# Altium footprint library WR-TBL_Pluggable PCB Header.PcbLib: 719 footprints (part 27 of 45)
Each footprint in its own frame and in the unit in brackets; x right, y up, seen from the top. Pads: shape width x height; smd on the part's side, far side on the other; paste and mask are expansions set on the pad; w line width, h text height; cw(c..) or ccw(c..) is an arc to the next point about the centre after c.
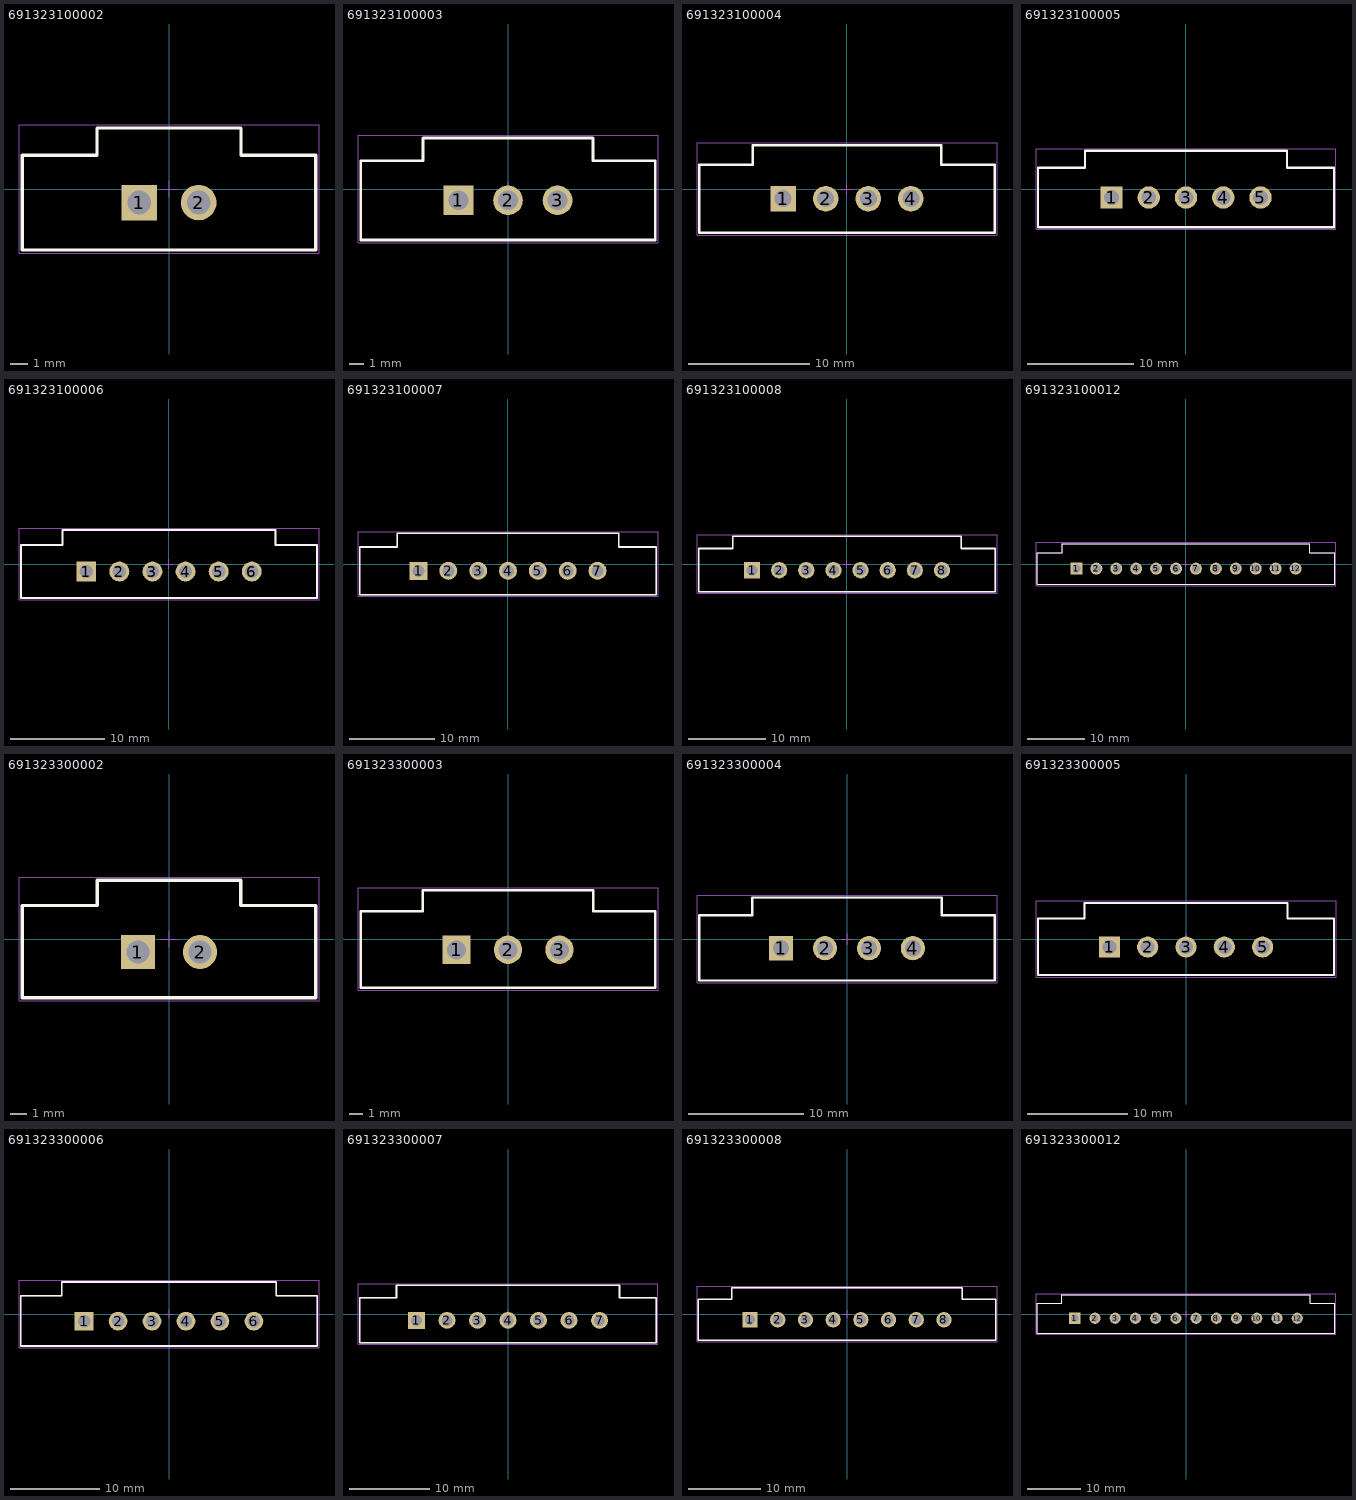
[diagram p26: the footprints below, top view; thin cyan lines are the x and y axes]

## 691323100002 [mm] "Vertical PCB Header with Flanges, pitch 3.5mm, 02p"
height 9.2
pads (2):
  rect 2.1x2.1 hole 1.4: 1(-1.75,-0.8)
  round 2.1 hole 1.4: 2(1.75,-0.8)
Top Overlay:
  lines w0.2: -8.65,-3.6 8.65,-3.6 8.65,2 4.25,2 4.25,3.6 -4.25,3.6 -4.25,2 -8.65,2 -8.65,-3.6
Mechanical 13:
  lines w0.1: -8.65,-3.6 -8.65,2 -4.25,2 -4.25,3.6 4.25,3.6 4.25,2 8.65,2 8.65,-3.6 -8.65,-3.6
Mechanical 15:
  lines w0.05: -0.5,0 0.5,0 ; 0,-0.5 0,0.5 ; -8.85,-3.8 8.85,-3.8 8.85,3.8 -8.85,3.8 -8.85,-3.8
3D body "691323100002.stp": height 9.3, standoff -3.4, extent -8.65,-3.6 8.65,3.6

## 691323100003 [mm] "Vertical PCB Header with Flanges, pitch 3.5mm, 03p"
height 9.2
pads (3):
  rect 2.1x2.1 hole 1.4: 1(-3.5,-0.8)
  round 2.1 hole 1.4: 2(0,-0.8) 3(3.5,-0.8)
Top Overlay:
  lines w0.2: -10.4,-3.6 -10.4,2 -6,2 -6,3.6 6,3.6 6,2 10.4,2 10.4,-3.6 -10.4,-3.6
Mechanical 13:
  lines w0.1: -10.4,-3.6 10.4,-3.6 10.4,2 6,2 6,3.6 -6,3.6 -6,2 -10.4,2 -10.4,-3.6
Mechanical 15:
  lines w0.05: -0.5,0 0.5,0 ; 0,-0.5 0,0.5 ; -10.6,-3.8 -10.6,3.8 10.6,3.8 10.6,-3.8 -10.6,-3.8
3D body "691323100003.stp": height 9.3, standoff -3.4, extent -10.4,-3.6 10.4,3.6

## 691323100004 [mm] "Vertical PCB Header with Flanges, pitch 3.5mm, 04p"
height 9.2
pads (4):
  rect 2.1x2.1 hole 1.4: 1(-5.25,-0.8)
  round 2.1 hole 1.4: 2(-1.75,-0.8) 3(1.75,-0.8) 4(5.25,-0.8)
Top Overlay:
  lines w0.2: -12.15,-3.6 -12.15,2 -7.75,2 -7.75,3.6 7.75,3.6 7.75,2 12.15,2 12.15,-3.6 -12.15,-3.6
Mechanical 13:
  lines w0.1: -12.15,-3.6 12.15,-3.6 12.15,2 7.75,2 7.75,3.6 -7.75,3.6 -7.75,2 -12.15,2 -12.15,-3.6
Mechanical 15:
  lines w0.05: -0.5,0 0.5,0 ; 0,-0.5 0,0.5 ; -12.35,-3.8 -12.35,3.8 12.35,3.8 12.35,-3.8 -12.35,-3.8
3D body "691323100004.stp": height 9.3, standoff -3.4, extent -12.15,-3.6 12.15,3.6

## 691323100005 [mm] "Vertical PCB Header with Flanges, pitch 3.5mm, 05p"
height 9.2
pads (5):
  rect 2.1x2.1 hole 1.4: 1(-7,-0.8)
  round 2.1 hole 1.4: 2(-3.5,-0.8) 3(0,-0.8) 4(3.5,-0.8) 5(7,-0.8)
Top Overlay:
  lines w0.2: -13.9,-3.6 -13.9,2 -9.5,2 -9.5,3.6 9.5,3.6 9.5,2 13.9,2 13.9,-3.6 -13.9,-3.6
Mechanical 13:
  lines w0.1: -13.9,-3.6 13.9,-3.6 13.9,2 9.5,2 9.5,3.6 -9.5,3.6 -9.5,2 -13.9,2 -13.9,-3.6
Mechanical 15:
  lines w0.05: -0.5,0 0.5,0 ; 0,-0.5 0,0.5 ; -14.1,-3.8 -14.1,3.8 14.1,3.8 14.1,-3.8 -14.1,-3.8
3D body "691323100005.stp": height 9.3, standoff -3.4, extent -13.9,-3.6 13.9,3.6

## 691323100006 [mm] "Vertical PCB Header with Flanges, pitch 3.5mm, 06p"
height 9.2
pads (6):
  rect 2.1x2.1 hole 1.4: 1(-8.75,-0.8)
  round 2.1 hole 1.4: 2(-5.25,-0.8) 3(-1.75,-0.8) 4(1.75,-0.8) 5(5.25,-0.8) 6(8.75,-0.8)
Top Overlay:
  lines w0.2: -15.65,-3.6 -15.65,2 -11.25,2 -11.25,3.6 11.25,3.6 11.25,2 15.65,2 15.65,-3.6 -15.65,-3.6
Mechanical 13:
  lines w0.1: -15.65,-3.6 15.65,-3.6 15.65,2 11.25,2 11.25,3.6 -11.25,3.6 -11.25,2 -15.65,2 -15.65,-3.6
Mechanical 15:
  lines w0.05: -0.5,0 0.5,0 ; 0,-0.5 0,0.5 ; -15.85,-3.8 -15.85,3.8 15.85,3.8 15.85,-3.8 -15.85,-3.8
3D body "691323100006.stp": height 9.3, standoff -3.4, extent -15.65,-3.6 15.65,3.6

## 691323100007 [mm] "Vertical PCB Header with Flanges, pitch 3.5mm, 07p"
height 9.2
pads (7):
  rect 2.1x2.1 hole 1.4: 1(-10.5,-0.8)
  round 2.1 hole 1.4: 2(-7,-0.8) 3(-3.5,-0.8) 4(0,-0.8) 5(3.5,-0.8) 6(7,-0.8) 7(10.5,-0.8)
Top Overlay:
  lines w0.2: -17.4,-3.6 17.4,-3.6 17.4,2 13,2 13,3.6 -13,3.6 -13,2 -17.4,2 -17.4,-3.6
Mechanical 13:
  lines w0.1: -17.4,-3.6 -17.4,2 -13,2 -13,3.6 13,3.6 13,2 17.4,2 17.4,-3.6 -17.4,-3.6
Mechanical 15:
  lines w0.05: -0.5,0 0.5,0 ; 0,-0.5 0,0.5 ; -17.6,-3.8 17.6,-3.8 17.6,3.8 -17.6,3.8 -17.6,-3.8
3D body "691323100007.stp": height 9.3, standoff -3.4, extent -17.4,-3.6 17.4,3.6

## 691323100008 [mm] "Vertical PCB Header with Flanges, pitch 3.5mm, 08p"
height 9.2
pads (8):
  rect 2.1x2.1 hole 1.4: 1(-12.25,-0.8)
  round 2.1 hole 1.4: 2(-8.75,-0.8) 3(-5.25,-0.8) 4(-1.75,-0.8) 5(1.75,-0.8) 6(5.25,-0.8) 7(8.75,-0.8) 8(12.25,-0.8)
Top Overlay:
  lines w0.2: -19.15,-3.6 19.15,-3.6 19.15,2 14.75,2 14.75,3.6 -14.75,3.6 -14.75,2 -19.15,2 -19.15,-3.6
Mechanical 13:
  lines w0.1: -19.15,-3.6 -19.15,2 -14.75,2 -14.75,3.6 14.75,3.6 14.75,2 19.15,2 19.15,-3.6 -19.15,-3.6
Mechanical 15:
  lines w0.05: -0.5,0 0.5,0 ; 0,-0.5 0,0.5 ; -19.35,-3.8 19.35,-3.8 19.35,3.8 -19.35,3.8 -19.35,-3.8
3D body "691323100008.stp": height 9.3, standoff -3.4, extent -19.15,-3.6 19.15,3.6

## 691323100012 [mm] "Vertical PCB Header with Flanges, pitch 3.5mm, 12p"
height 9.2
pads (12):
  rect 2.1x2.1 hole 1.4: 1(-19.25,-0.8)
  round 2.1 hole 1.4: 2(-15.75,-0.8) 3(-12.25,-0.8) 4(-8.75,-0.8) 5(-5.25,-0.8) 6(-1.75,-0.8) 7(1.75,-0.8) 8(5.25,-0.8) 9(8.75,-0.8) 10(12.25,-0.8) 11(15.75,-0.8) 12(19.25,-0.8)
Top Overlay:
  lines w0.2: -26.15,-3.6 26.15,-3.6 26.15,2 21.75,2 21.75,3.6 -21.75,3.6 -21.75,2 -26.15,2 -26.15,-3.6
Mechanical 13:
  lines w0.1: -26.15,-3.6 -26.15,2 -21.75,2 -21.75,3.6 21.75,3.6 21.75,2 26.15,2 26.15,-3.6 -26.15,-3.6
Mechanical 15:
  lines w0.05: -0.5,0 0.5,0 ; 0,-0.5 0,0.5 ; -26.35,-3.8 26.35,-3.8 26.35,3.8 -26.35,3.8 -26.35,-3.8
3D body "691323100012.stp": height 9.3, standoff -3.4, extent -26.15,-3.6 26.15,3.6

## 691323300002 [mm] "Vertical PCB Header with Flanges, pitch 3.81mm, 02p"
height 9.2
pads (2):
  rect 2.1x2.1 hole 1.4: 1(-1.905,-0.8)
  round 2.1 hole 1.4: 2(1.905,-0.8)
Top Overlay:
  lines w0.2: -9.005,-3.6 -9.005,2.05 -4.4,2.05 -4.4,3.6 4.4,3.6 4.4,2.05 9.005,2.05 9.005,-3.6 -9.005,-3.6
Mechanical 13:
  lines w0.1: -9.005,-3.6 9.005,-3.6 9.005,2.05 4.4,2.05 4.4,3.6 -4.4,3.6 -4.4,2.05 -9.005,2.05 -9.005,-3.6
Mechanical 15:
  lines w0.05: -0.5,0 0.5,0 ; 0,-0.5 0,0.5 ; -9.205,-3.8 -9.205,3.8 9.205,3.8 9.205,-3.8 -9.205,-3.8
3D body "691323300002.stp": height 9.25, standoff -3.45, extent -9.005,-3.6 9.005,3.6

## 691323300003 [mm] "Vertical PCB Header with Flanges, pitch 3.81mm, 03p"
height 9.2
pads (3):
  rect 2.1x2.1 hole 1.4: 1(-3.81,-0.8)
  round 2.1 hole 1.4: 2(0,-0.8) 3(3.81,-0.8)
Top Overlay:
  lines w0.2: -10.91,-3.6 10.91,-3.6 10.91,2.05 6.305,2.05 6.305,3.6 -6.305,3.6 -6.305,2.05 -10.91,2.05 -10.91,-3.6
Mechanical 13:
  lines w0.1: -10.91,-3.6 -10.91,2.05 -6.305,2.05 -6.305,3.6 6.305,3.6 6.305,2.05 10.91,2.05 10.91,-3.6 -10.91,-3.6
Mechanical 15:
  lines w0.05: -0.5,0 0.5,0 ; 0,-0.5 0,0.5 ; -11.11,-3.8 11.11,-3.8 11.11,3.8 -11.11,3.8 -11.11,-3.8
3D body "691323300003.stp": height 9.25, standoff -3.45, extent -10.91,-3.6 10.91,3.6

## 691323300004 [mm] "Vertical PCB Header with Flanges, pitch 3.81mm, 04p"
height 9.2
pads (4):
  rect 2.1x2.1 hole 1.4: 1(-5.715,-0.8)
  round 2.1 hole 1.4: 2(-1.905,-0.8) 3(1.905,-0.8) 4(5.715,-0.8)
Top Overlay:
  lines w0.2: -12.815,-3.6 -12.815,2.05 -8.21,2.05 -8.21,3.6 8.21,3.6 8.21,2.05 12.815,2.05 12.815,-3.6 -12.815,-3.6
Mechanical 13:
  lines w0.1: -12.815,-3.6 12.815,-3.6 12.815,2.05 8.21,2.05 8.21,3.6 -8.21,3.6 -8.21,2.05 -12.815,2.05 -12.815,-3.6
Mechanical 15:
  lines w0.05: -0.5,0 0.5,0 ; 0,-0.5 0,0.5 ; -13.015,-3.8 -13.015,3.8 13.015,3.8 13.015,-3.8 -13.015,-3.8
3D body "691323300004.stp": height 9.25, standoff -3.45, extent -12.815,-3.6 12.815,3.6

## 691323300005 [mm] "Vertical PCB Header with Flanges, pitch 3.81mm, 05p"
height 9.2
pads (5):
  rect 2.1x2.1 hole 1.4: 1(-7.62,-0.8)
  round 2.1 hole 1.4: 2(-3.81,-0.8) 3(0,-0.8) 4(3.81,-0.8) 5(7.62,-0.8)
Top Overlay:
  lines w0.2: -14.72,-3.6 -14.72,2.05 -10.115,2.05 -10.115,3.6 10.115,3.6 10.115,2.05 14.72,2.05 14.72,-3.6 -14.72,-3.6
Mechanical 13:
  lines w0.1: -14.72,-3.6 14.72,-3.6 14.72,2.05 10.115,2.05 10.115,3.6 -10.115,3.6 -10.115,2.05 -14.72,2.05 -14.72,-3.6
Mechanical 15:
  lines w0.05: -0.5,0 0.5,0 ; 0,-0.5 0,0.5 ; -14.92,-3.8 -14.92,3.8 14.92,3.8 14.92,-3.8 -14.92,-3.8
3D body "691323300005.stp": height 9.25, standoff -3.45, extent -14.72,-3.6 14.72,3.6

## 691323300006 [mm] "Vertical PCB Header with Flanges, pitch 3.81mm, 06p"
height 9.2
pads (6):
  rect 2.1x2.1 hole 1.4: 1(-9.525,-0.8)
  round 2.1 hole 1.4: 2(-5.715,-0.8) 3(-1.905,-0.8) 4(1.905,-0.8) 5(5.715,-0.8) 6(9.525,-0.8)
Top Overlay:
  lines w0.2: -16.625,-3.6 -16.625,2.05 -12.02,2.05 -12.02,3.6 12.02,3.6 12.02,2.05 16.625,2.05 16.625,-3.6 -16.625,-3.6
Mechanical 13:
  lines w0.1: -16.625,-3.6 16.625,-3.6 16.625,2.05 12.02,2.05 12.02,3.6 -12.02,3.6 -12.02,2.05 -16.625,2.05 -16.625,-3.6
Mechanical 15:
  lines w0.05: -0.5,0 0.5,0 ; 0,-0.5 0,0.5 ; -16.825,-3.8 -16.825,3.8 16.825,3.8 16.825,-3.8 -16.825,-3.8
3D body "691323300006.stp": height 9.25, standoff -3.45, extent -16.625,-3.6 16.625,3.6

## 691323300007 [mm] "Vertical PCB Header with Flanges, pitch 3.81mm, 07p"
height 9.2
pads (7):
  rect 2.1x2.1 hole 1.4: 1(-11.43,-0.8)
  round 2.1 hole 1.4: 2(-7.62,-0.8) 3(-3.81,-0.8) 4(0,-0.8) 5(3.81,-0.8) 6(7.62,-0.8) 7(11.43,-0.8)
Top Overlay:
  lines w0.2: -18.53,-3.6 -18.53,2.05 -13.925,2.05 -13.925,3.6 13.925,3.6 13.925,2.05 18.53,2.05 18.53,-3.6 -18.53,-3.6
Mechanical 13:
  lines w0.1: -18.53,-3.6 18.53,-3.6 18.53,2.05 13.925,2.05 13.925,3.6 -13.925,3.6 -13.925,2.05 -18.53,2.05 -18.53,-3.6
Mechanical 15:
  lines w0.05: -0.5,0 0.5,0 ; 0,-0.5 0,0.5 ; -18.73,-3.8 -18.73,3.8 18.73,3.8 18.73,-3.8 -18.73,-3.8
3D body "691323300007.stp": height 9.25, standoff -3.45, extent -18.53,-3.6 18.53,3.6

## 691323300008 [mm] "Vertical PCB Header with Flanges, pitch 3.81mm, 08p"
height 9.2
pads (8):
  rect 2.1x2.1 hole 1.4: 1(-13.335,-0.8)
  round 2.1 hole 1.4: 2(-9.525,-0.8) 3(-5.715,-0.8) 4(-1.905,-0.8) 5(1.905,-0.8) 6(5.715,-0.8) 7(9.525,-0.8) 8(13.335,-0.8)
Top Overlay:
  lines w0.2: -20.435,-3.6 -20.435,2.05 -15.83,2.05 -15.83,3.6 15.83,3.6 15.83,2.05 20.435,2.05 20.435,-3.6 -20.435,-3.6
Mechanical 13:
  lines w0.1: -20.435,-3.6 20.435,-3.6 20.435,2.05 15.83,2.05 15.83,3.6 -15.83,3.6 -15.83,2.05 -20.435,2.05 -20.435,-3.6
Mechanical 15:
  lines w0.05: -0.5,0 0.5,0 ; 0,-0.5 0,0.5 ; -20.635,-3.8 -20.635,3.8 20.635,3.8 20.635,-3.8 -20.635,-3.8
3D body "691323300008.stp": height 9.25, standoff -3.45, extent -20.435,-3.6 20.435,3.6

## 691323300012 [mm] "Vertical PCB Header with Flanges, pitch 3.81mm, 12p"
height 9.2
pads (12):
  rect 2.1x2.1 hole 1.4: 1(-20.955,-0.8)
  round 2.1 hole 1.4: 2(-17.145,-0.8) 3(-13.335,-0.8) 4(-9.525,-0.8) 5(-5.715,-0.8) 6(-1.905,-0.8) 7(1.905,-0.8) 8(5.715,-0.8) 9(9.525,-0.8) 10(13.335,-0.8) 11(17.145,-0.8) 12(20.955,-0.8)
Top Overlay:
  lines w0.2: -28.055,-3.6 28.055,-3.6 28.055,2.05 23.45,2.05 23.45,3.6 -23.45,3.6 -23.45,2.05 -28.055,2.05 -28.055,-3.6
Mechanical 13:
  lines w0.1: -28.055,-3.6 -28.055,2.05 -23.45,2.05 -23.45,3.6 23.45,3.6 23.45,2.05 28.055,2.05 28.055,-3.6 -28.055,-3.6
Mechanical 15:
  lines w0.05: -0.5,0 0.5,0 ; 0,-0.5 0,0.5 ; -28.255,-3.8 28.255,-3.8 28.255,3.8 -28.255,3.8 -28.255,-3.8
3D body "691323300012.stp": height 9.25, standoff -3.45, extent -28.055,-3.6 28.055,3.6